# Altium footprint library SMD Active.PcbLib: 76 footprints (part 7 of 8)
Each footprint in its own frame and in the unit in brackets; x right, y up, seen from the top. Pads: shape width x height; smd on the part's side, far side on the other; paste and mask are expansions set on the pad; w line width, h text height; cw(c..) or ccw(c..) is an arc to the next point about the centre after c.
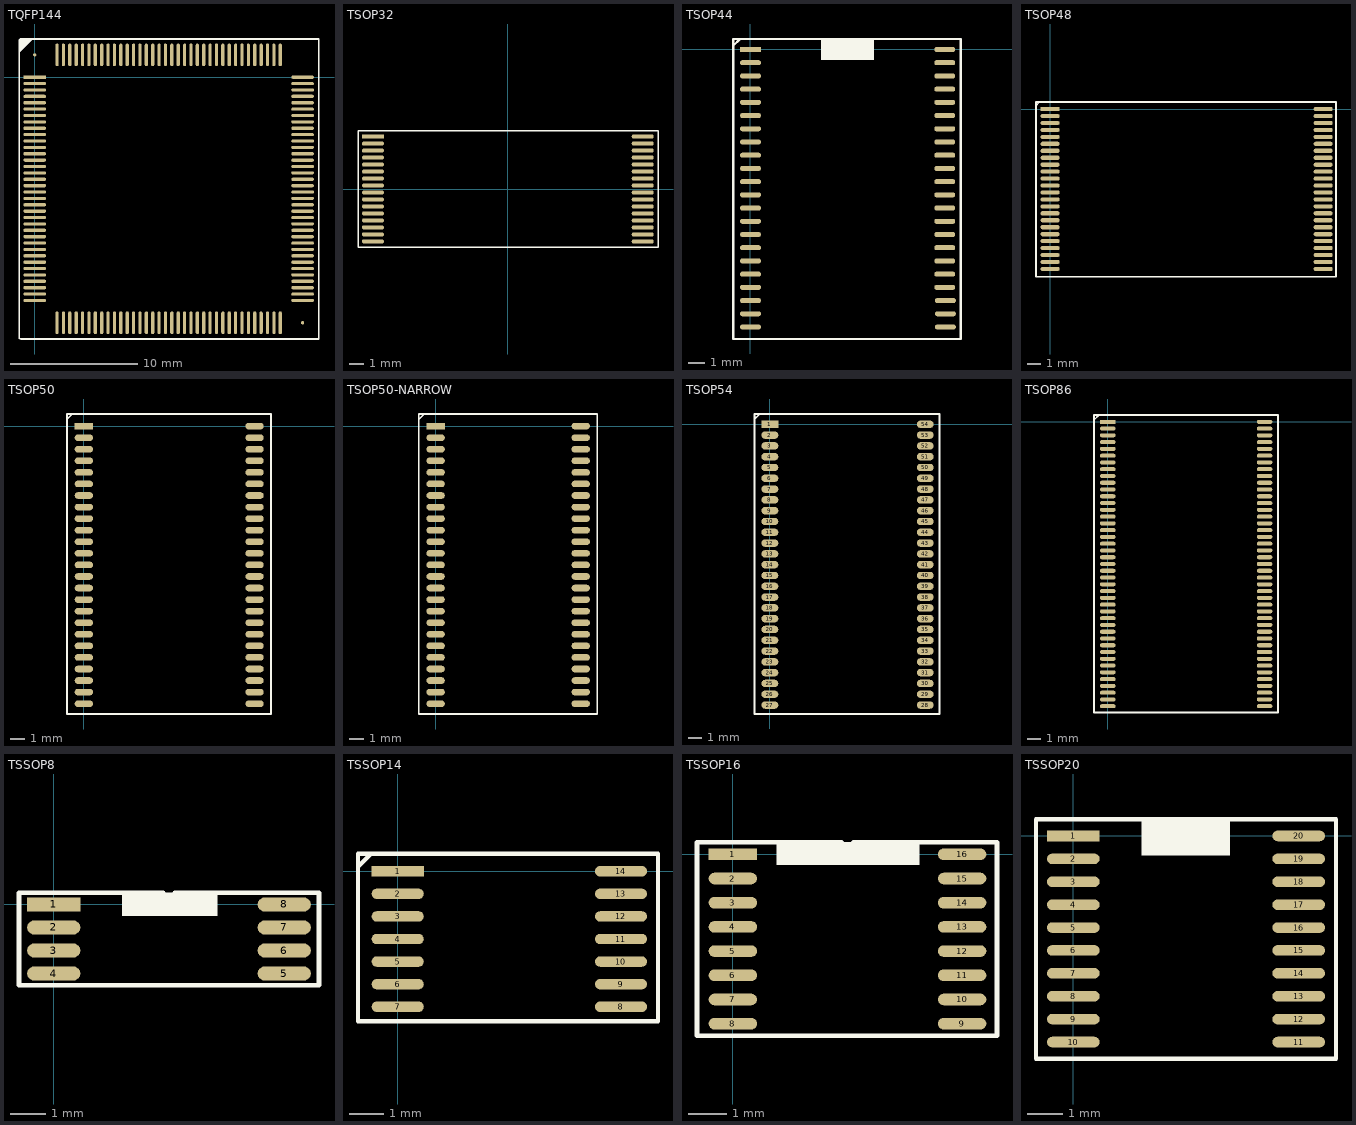
[diagram p6: the footprints below, top view; thin cyan lines are the x and y axes]

## TQFP144 [mil]
pads (146):
  rect 70x10 smd: 1(0,0)
  oval 70x10 smd: 2(0,-19.68) 3(0,-39.37) 4(0,-59.05) 5(0,-78.74) 6(0,-98.42) 7(0,-118.11) 8(0,-137.79) 9(0,-157.48) 10(0,-177.16) 11(0,-196.85) 12(0,-216.53) 13(0,-236.22) 14(0,-255.91) 15(0,-275.59) 16(0,-295.27) 17(0,-314.96) 18(0,-334.64) 19(0,-354.33) 20(0,-374.01) 21(0,-393.7) 22(0,-413.38) 23(0,-433.07) 24(0,-452.75) 25(0,-472.44) 26(0,-492.12) 27(0,-511.81) 28(0,-531.5) 29(0,-551.18) 30(0,-570.87) 31(0,-590.55) 32(0,-610.24) 33(0,-629.92) 34(0,-649.61) 35(0,-669.29) 36(0,-688.98) 73(826.77,-688.98) 74(826.77,-669.29) 75(826.77,-649.61) 76(826.77,-629.92) 77(826.77,-610.24) 78(826.77,-590.55) 79(826.77,-570.87) 80(826.77,-551.18) 81(826.77,-531.5) 82(826.77,-511.81) 83(826.77,-492.12) 84(826.77,-472.44) 85(826.77,-452.75) 86(826.77,-433.07) 87(826.77,-413.38) 88(826.77,-393.7) 89(826.77,-374.01) 90(826.77,-354.33) 91(826.77,-334.64) 92(826.77,-314.96) 93(826.77,-295.27) 94(826.77,-275.59) 95(826.77,-255.91) 96(826.77,-236.22) 97(826.77,-216.53) 98(826.77,-196.85) 99(826.77,-177.16) 100(826.77,-157.48) 101(826.77,-137.79) 102(826.77,-118.11) 103(826.77,-98.42) 104(826.77,-78.74) 105(826.77,-59.05) 106(826.77,-39.37) 107(826.77,-19.68) 108(826.77,0)
  oval 10x70 smd: 37(68.9,-757.87) 38(88.58,-757.87) 39(108.27,-757.87) 40(127.95,-757.87) 41(147.64,-757.87) 42(167.32,-757.87) 43(187.01,-757.87) 44(206.69,-757.87) 45(226.38,-757.87) 46(246.06,-757.87) 47(265.75,-757.87) 48(285.43,-757.87) 49(305.12,-757.87) 50(324.8,-757.87) 51(344.49,-757.87) 52(364.17,-757.87) 53(383.86,-757.87) 54(403.54,-757.87) 55(423.23,-757.87) 56(442.91,-757.87) 57(462.6,-757.87) 58(482.28,-757.87) 59(501.97,-757.87) 60(521.65,-757.87) 61(541.34,-757.87) 62(561.02,-757.87) 63(580.71,-757.87) 64(600.39,-757.87) 65(620.08,-757.87) 66(639.76,-757.87) 67(659.45,-757.87) 68(679.13,-757.87) 69(698.82,-757.87) 70(718.5,-757.87) 71(738.19,-757.87) 72(757.87,-757.87) 109(757.87,68.9) 110(738.19,68.9) 111(718.5,68.9) 112(698.82,68.9) 113(679.13,68.9) 114(659.45,68.9) 115(639.76,68.9) 116(620.08,68.9) 117(600.39,68.9) 118(580.71,68.9) 119(561.02,68.9) 120(541.34,68.9) 121(521.65,68.9) 122(501.97,68.9) 123(482.28,68.9) 124(462.6,68.9) 125(442.91,68.9) 126(423.23,68.9) 127(403.54,68.9) 128(383.86,68.9) 129(364.17,68.9) 130(344.49,68.9) 131(324.8,68.9) 132(305.12,68.9) 133(285.43,68.9) 134(265.75,68.9) 135(246.06,68.9) 136(226.38,68.9) 137(206.69,68.9) 138(187.01,68.9) 139(167.32,68.9) 140(147.64,68.9) 141(127.95,68.9) 142(108.27,68.9) 143(88.58,68.9) 144(68.9,68.9)
  round 10 smd: F1(0,68.9) F1(826.77,-757.87)
Top Overlay:
  lines w5: -20.12,114.88 -45.12,89.88 ; -13,118 -45,118 -48.12,114.88 ; -48.12,114.88 -35.12,114.88 ; -48.12,114.88 -42,118 877,118 877,-808 -43,-808 -48.12,-805.88 -48.12,114.88 ; -48.12,114.88 -48.12,107.88 -41.12,114.88 ; -45.12,89.88 -45.12,94.88 -25.12,114.88 ; -45.12,89.88 -45.12,110.88 ; -45.12,89.88 -45.12,110.88 ; -45.12,110.88 -41.12,114.88 ; -45.12,110.88 -41.12,114.88 ; -41.12,114.88 -25.12,114.88 ; -41.12,114.88 -16.24,114.88 -48.12,83 -48.12,77.88 -11.12,114.88 -25.12,114.88 ; -41.12,114.88 -35.12,114.88 ; -35.12,114.88 -45.12,104.88 -45.12,99.88 -30.12,114.88 -25.12,114.88
3D body: height 12, standoff 0, extent 752.24,53.9 764.24,75.9
3D body: height 25, standoff 12, extent 752.24,29.9 764.24,62.4
3D body: height 25, standoff 12, extent 732.56,29.9 744.56,62.4
3D body: height 12, standoff 0, extent 732.56,53.9 744.56,75.9
3D body: height 25, standoff 12, extent 712.87,29.9 724.87,62.4
3D body: height 12, standoff 0, extent 712.87,53.9 724.87,75.9
3D body: height 25, standoff 12, extent 693.19,29.9 705.19,62.4
3D body: height 12, standoff 0, extent 693.19,53.9 705.19,75.9
3D body: height 25, standoff 12, extent 673.5,29.9 685.5,62.4
3D body: height 12, standoff 0, extent 673.5,53.9 685.5,75.9
3D body: height 25, standoff 12, extent 653.82,29.9 665.82,62.4
3D body: height 12, standoff 0, extent 653.82,53.9 665.82,75.9
3D body: height 12, standoff 0, extent 535.71,53.9 547.71,75.9
3D body: height 25, standoff 12, extent 535.71,29.9 547.71,62.4
3D body: height 12, standoff 0, extent 555.39,53.9 567.39,75.9
3D body: height 25, standoff 12, extent 555.39,29.9 567.39,62.4
3D body: height 12, standoff 0, extent 575.08,53.9 587.08,75.9
3D body: height 25, standoff 12, extent 575.08,29.9 587.08,62.4
3D body: height 12, standoff 0, extent 594.76,53.9 606.76,75.9
3D body: height 25, standoff 12, extent 594.76,29.9 606.76,62.4
3D body: height 12, standoff 0, extent 614.45,53.9 626.45,75.9
3D body: height 25, standoff 12, extent 614.45,29.9 626.45,62.4
3D body: height 25, standoff 12, extent 634.13,29.9 646.13,62.4
3D body: height 12, standoff 0, extent 634.13,53.9 646.13,75.9
3D body: height 12, standoff 0, extent 417.6,53.9 429.6,75.9
3D body: height 25, standoff 12, extent 417.6,29.9 429.6,62.4
3D body: height 12, standoff 0, extent 437.28,53.9 449.28,75.9
3D body: height 25, standoff 12, extent 437.28,29.9 449.28,62.4
3D body: height 12, standoff 0, extent 456.97,53.9 468.97,75.9
3D body: height 25, standoff 12, extent 456.97,29.9 468.97,62.4
3D body: height 12, standoff 0, extent 476.65,53.9 488.65,75.9
3D body: height 25, standoff 12, extent 476.65,29.9 488.65,62.4
3D body: height 12, standoff 0, extent 496.34,53.9 508.34,75.9
3D body: height 25, standoff 12, extent 496.34,29.9 508.34,62.4
3D body: height 25, standoff 12, extent 516.02,29.9 528.02,62.4
3D body: height 12, standoff 0, extent 516.02,53.9 528.02,75.9
3D body: height 12, standoff 0, extent 299.49,53.9 311.49,75.9
3D body: height 25, standoff 12, extent 299.49,29.9 311.49,62.4
3D body: height 12, standoff 0, extent 319.17,53.9 331.17,75.9
3D body: height 25, standoff 12, extent 319.17,29.9 331.17,62.4
3D body: height 12, standoff 0, extent 338.86,53.9 350.86,75.9
3D body: height 25, standoff 12, extent 338.86,29.9 350.86,62.4
3D body: height 12, standoff 0, extent 358.54,53.9 370.54,75.9
3D body: height 25, standoff 12, extent 358.54,29.9 370.54,62.4
3D body: height 12, standoff 0, extent 378.23,53.9 390.23,75.9
3D body: height 25, standoff 12, extent 378.23,29.9 390.23,62.4
3D body: height 25, standoff 12, extent 397.91,29.9 409.91,62.4
3D body: height 12, standoff 0, extent 397.91,53.9 409.91,75.9
3D body: height 12, standoff 0, extent 181.38,53.9 193.38,75.9
3D body: height 25, standoff 12, extent 181.38,29.9 193.38,62.4
3D body: height 12, standoff 0, extent 201.06,53.9 213.06,75.9
3D body: height 25, standoff 12, extent 201.06,29.9 213.06,62.4
3D body: height 12, standoff 0, extent 220.75,53.9 232.75,75.9
3D body: height 25, standoff 12, extent 220.75,29.9 232.75,62.4
3D body: height 12, standoff 0, extent 240.43,53.9 252.43,75.9
3D body: height 25, standoff 12, extent 240.43,29.9 252.43,62.4
3D body: height 12, standoff 0, extent 260.12,53.9 272.12,75.9
3D body: height 25, standoff 12, extent 260.12,29.9 272.12,62.4
3D body: height 25, standoff 12, extent 279.8,29.9 291.8,62.4
3D body: height 12, standoff 0, extent 279.8,53.9 291.8,75.9
3D body: height 12, standoff 0, extent 63.27,53.9 75.27,75.9
3D body: height 25, standoff 12, extent 63.27,29.9 75.27,62.4
3D body: height 12, standoff 0, extent 82.95,53.9 94.95,75.9
3D body: height 25, standoff 12, extent 82.95,29.9 94.95,62.4
3D body: height 12, standoff 0, extent 102.64,53.9 114.64,75.9
3D body: height 25, standoff 12, extent 102.64,29.9 114.64,62.4
3D body: height 12, standoff 0, extent 122.32,53.9 134.32,75.9
3D body: height 25, standoff 12, extent 122.32,29.9 134.32,62.4
3D body: height 12, standoff 0, extent 142.01,53.9 154.01,75.9
3D body: height 25, standoff 12, extent 142.01,29.9 154.01,62.4
3D body: height 25, standoff 12, extent 161.69,29.9 173.69,62.4
3D body: height 12, standoff 0, extent 161.69,53.9 173.69,75.9
3D body: height 12, standoff 0, extent 811.77,-695.35 833.77,-683.35
3D body: height 25, standoff 12, extent 787.77,-695.35 820.27,-683.35
3D body: height 25, standoff 12, extent 787.77,-675.66 820.27,-663.66
3D body: height 12, standoff 0, extent 811.77,-675.66 833.77,-663.66
3D body: height 25, standoff 12, extent 787.77,-655.98 820.27,-643.98
3D body: height 12, standoff 0, extent 811.77,-655.98 833.77,-643.98
3D body: height 25, standoff 12, extent 787.77,-636.29 820.27,-624.29
3D body: height 12, standoff 0, extent 811.77,-636.29 833.77,-624.29
3D body: height 25, standoff 12, extent 787.77,-616.61 820.27,-604.61
3D body: height 12, standoff 0, extent 811.77,-616.61 833.77,-604.61
3D body: height 25, standoff 12, extent 787.77,-596.92 820.27,-584.92
3D body: height 12, standoff 0, extent 811.77,-596.92 833.77,-584.92
3D body: height 12, standoff 0, extent 811.77,-478.81 833.77,-466.81
3D body: height 25, standoff 12, extent 787.77,-478.81 820.27,-466.81
3D body: height 12, standoff 0, extent 811.77,-498.5 833.77,-486.5
3D body: height 25, standoff 12, extent 787.77,-498.5 820.27,-486.5
3D body: height 12, standoff 0, extent 811.77,-518.18 833.77,-506.18
3D body: height 25, standoff 12, extent 787.77,-518.18 820.27,-506.18
3D body: height 12, standoff 0, extent 811.77,-537.87 833.77,-525.87
3D body: height 25, standoff 12, extent 787.77,-537.87 820.27,-525.87
3D body: height 12, standoff 0, extent 811.77,-557.55 833.77,-545.55
3D body: height 25, standoff 12, extent 787.77,-557.55 820.27,-545.55
3D body: height 25, standoff 12, extent 787.77,-577.24 820.27,-565.24
3D body: height 12, standoff 0, extent 811.77,-577.24 833.77,-565.24
3D body: height 12, standoff 0, extent 811.77,-360.7 833.77,-348.7
3D body: height 25, standoff 12, extent 787.77,-360.7 820.27,-348.7
3D body: height 12, standoff 0, extent 811.77,-380.39 833.77,-368.39
3D body: height 25, standoff 12, extent 787.77,-380.39 820.27,-368.39
3D body: height 12, standoff 0, extent 811.77,-400.07 833.77,-388.07
3D body: height 25, standoff 12, extent 787.77,-400.07 820.27,-388.07
3D body: height 12, standoff 0, extent 811.77,-419.76 833.77,-407.76
3D body: height 25, standoff 12, extent 787.77,-419.76 820.27,-407.76
3D body: height 12, standoff 0, extent 811.77,-439.44 833.77,-427.44
3D body: height 25, standoff 12, extent 787.77,-439.44 820.27,-427.44
3D body: height 25, standoff 12, extent 787.77,-459.13 820.27,-447.13
3D body: height 12, standoff 0, extent 811.77,-459.13 833.77,-447.13
3D body: height 12, standoff 0, extent 811.77,-242.59 833.77,-230.59
3D body: height 25, standoff 12, extent 787.77,-242.59 820.27,-230.59
3D body: height 12, standoff 0, extent 811.77,-262.28 833.77,-250.28
3D body: height 25, standoff 12, extent 787.77,-262.28 820.27,-250.28
3D body: height 12, standoff 0, extent 811.77,-281.96 833.77,-269.96
3D body: height 25, standoff 12, extent 787.77,-281.96 820.27,-269.96
3D body: height 12, standoff 0, extent 811.77,-301.65 833.77,-289.65
3D body: height 25, standoff 12, extent 787.77,-301.65 820.27,-289.65
3D body: height 12, standoff 0, extent 811.77,-321.33 833.77,-309.33
3D body: height 25, standoff 12, extent 787.77,-321.33 820.27,-309.33
3D body: height 25, standoff 12, extent 787.77,-341.02 820.27,-329.02
3D body: height 12, standoff 0, extent 811.77,-341.02 833.77,-329.02
3D body: height 12, standoff 0, extent 811.77,-124.48 833.77,-112.48
3D body: height 25, standoff 12, extent 787.77,-124.48 820.27,-112.48
3D body: height 12, standoff 0, extent 811.77,-144.17 833.77,-132.17
3D body: height 25, standoff 12, extent 787.77,-144.17 820.27,-132.17
3D body: height 12, standoff 0, extent 811.77,-163.85 833.77,-151.85
3D body: height 25, standoff 12, extent 787.77,-163.85 820.27,-151.85
3D body: height 12, standoff 0, extent 811.77,-183.54 833.77,-171.54
3D body: height 25, standoff 12, extent 787.77,-183.54 820.27,-171.54
3D body: height 12, standoff 0, extent 811.77,-203.22 833.77,-191.22
3D body: height 25, standoff 12, extent 787.77,-203.22 820.27,-191.22
3D body: height 25, standoff 12, extent 787.77,-222.91 820.27,-210.91
3D body: height 12, standoff 0, extent 811.77,-222.91 833.77,-210.91
3D body: height 12, standoff 0, extent 811.77,-6.37 833.77,5.63
3D body: height 25, standoff 12, extent 787.77,-6.37 820.27,5.63
3D body: height 12, standoff 0, extent 811.77,-26.06 833.77,-14.06
3D body: height 25, standoff 12, extent 787.77,-26.06 820.27,-14.06
3D body: height 12, standoff 0, extent 811.77,-45.74 833.77,-33.74
3D body: height 25, standoff 12, extent 787.77,-45.74 820.27,-33.74
3D body: height 12, standoff 0, extent 811.77,-65.43 833.77,-53.43
3D body: height 25, standoff 12, extent 787.77,-65.43 820.27,-53.43
3D body: height 12, standoff 0, extent 811.77,-85.11 833.77,-73.11
3D body: height 25, standoff 12, extent 787.77,-85.11 820.27,-73.11
3D body: height 25, standoff 12, extent 787.77,-104.8 820.27,-92.8
3D body: height 12, standoff 0, extent 811.77,-104.8 833.77,-92.8
3D body: height 12, standoff 0, extent 62.53,-764.87 74.53,-742.87
3D body: height 25, standoff 12, extent 62.53,-751.37 74.53,-718.87
3D body: height 25, standoff 12, extent 82.21,-751.37 94.21,-718.87
3D body: height 12, standoff 0, extent 82.21,-764.87 94.21,-742.87
3D body: height 25, standoff 12, extent 101.9,-751.37 113.9,-718.87
3D body: height 12, standoff 0, extent 101.9,-764.87 113.9,-742.87
3D body: height 25, standoff 12, extent 121.58,-751.37 133.58,-718.87
3D body: height 12, standoff 0, extent 121.58,-764.87 133.58,-742.87
3D body: height 25, standoff 12, extent 141.27,-751.37 153.27,-718.87
3D body: height 12, standoff 0, extent 141.27,-764.87 153.27,-742.87
3D body: height 25, standoff 12, extent 160.95,-751.37 172.95,-718.87
3D body: height 12, standoff 0, extent 160.95,-764.87 172.95,-742.87
3D body: height 12, standoff 0, extent 279.06,-764.87 291.06,-742.87
3D body: height 25, standoff 12, extent 279.06,-751.37 291.06,-718.87
3D body: height 12, standoff 0, extent 259.38,-764.87 271.38,-742.87
3D body: height 25, standoff 12, extent 259.38,-751.37 271.38,-718.87
3D body: height 12, standoff 0, extent 239.69,-764.87 251.69,-742.87
3D body: height 25, standoff 12, extent 239.69,-751.37 251.69,-718.87
3D body: height 12, standoff 0, extent 220.01,-764.87 232.01,-742.87
3D body: height 25, standoff 12, extent 220.01,-751.37 232.01,-718.87
3D body: height 12, standoff 0, extent 200.32,-764.87 212.32,-742.87
3D body: height 25, standoff 12, extent 200.32,-751.37 212.32,-718.87
3D body: height 25, standoff 12, extent 180.64,-751.37 192.64,-718.87
3D body: height 12, standoff 0, extent 180.64,-764.87 192.64,-742.87
3D body: height 12, standoff 0, extent 397.17,-764.87 409.17,-742.87
3D body: height 25, standoff 12, extent 397.17,-751.37 409.17,-718.87
3D body: height 12, standoff 0, extent 377.49,-764.87 389.49,-742.87
3D body: height 25, standoff 12, extent 377.49,-751.37 389.49,-718.87
3D body: height 12, standoff 0, extent 357.8,-764.87 369.8,-742.87
3D body: height 25, standoff 12, extent 357.8,-751.37 369.8,-718.87
3D body: height 12, standoff 0, extent 338.12,-764.87 350.12,-742.87
3D body: height 25, standoff 12, extent 338.12,-751.37 350.12,-718.87
3D body: height 12, standoff 0, extent 318.43,-764.87 330.43,-742.87
3D body: height 25, standoff 12, extent 318.43,-751.37 330.43,-718.87
3D body: height 25, standoff 12, extent 298.75,-751.37 310.75,-718.87
3D body: height 12, standoff 0, extent 298.75,-764.87 310.75,-742.87
3D body: height 12, standoff 0, extent 515.28,-764.87 527.28,-742.87
3D body: height 25, standoff 12, extent 515.28,-751.37 527.28,-718.87
3D body: height 12, standoff 0, extent 495.6,-764.87 507.6,-742.87
3D body: height 25, standoff 12, extent 495.6,-751.37 507.6,-718.87
3D body: height 12, standoff 0, extent 475.91,-764.87 487.91,-742.87
3D body: height 25, standoff 12, extent 475.91,-751.37 487.91,-718.87
3D body: height 12, standoff 0, extent 456.23,-764.87 468.23,-742.87
3D body: height 25, standoff 12, extent 456.23,-751.37 468.23,-718.87
3D body: height 12, standoff 0, extent 436.54,-764.87 448.54,-742.87
3D body: height 25, standoff 12, extent 436.54,-751.37 448.54,-718.87
3D body: height 25, standoff 12, extent 416.86,-751.37 428.86,-718.87
3D body: height 12, standoff 0, extent 416.86,-764.87 428.86,-742.87
3D body: height 12, standoff 0, extent 633.39,-764.87 645.39,-742.87
3D body: height 25, standoff 12, extent 633.39,-751.37 645.39,-718.87
3D body: height 12, standoff 0, extent 613.71,-764.87 625.71,-742.87
3D body: height 25, standoff 12, extent 613.71,-751.37 625.71,-718.87
3D body: height 12, standoff 0, extent 594.02,-764.87 606.02,-742.87
3D body: height 25, standoff 12, extent 594.02,-751.37 606.02,-718.87
3D body: height 12, standoff 0, extent 574.34,-764.87 586.34,-742.87
3D body: height 25, standoff 12, extent 574.34,-751.37 586.34,-718.87
3D body: height 12, standoff 0, extent 554.65,-764.87 566.65,-742.87
3D body: height 25, standoff 12, extent 554.65,-751.37 566.65,-718.87
3D body: height 25, standoff 12, extent 534.97,-751.37 546.97,-718.87
3D body: height 12, standoff 0, extent 534.97,-764.87 546.97,-742.87
3D body: height 12, standoff 0, extent 751.5,-764.87 763.5,-742.87
3D body: height 25, standoff 12, extent 751.5,-751.37 763.5,-718.87
3D body: height 12, standoff 0, extent 731.82,-764.87 743.82,-742.87
3D body: height 25, standoff 12, extent 731.82,-751.37 743.82,-718.87
3D body: height 12, standoff 0, extent 712.13,-764.87 724.13,-742.87
3D body: height 25, standoff 12, extent 712.13,-751.37 724.13,-718.87
3D body: height 12, standoff 0, extent 692.45,-764.87 704.45,-742.87
3D body: height 25, standoff 12, extent 692.45,-751.37 704.45,-718.87
3D body: height 12, standoff 0, extent 672.76,-764.87 684.76,-742.87
3D body: height 25, standoff 12, extent 672.76,-751.37 684.76,-718.87
3D body: height 25, standoff 12, extent 653.08,-751.37 665.08,-718.87
3D body: height 12, standoff 0, extent 653.08,-764.87 665.08,-742.87
3D body: height 12, standoff 0, extent -7,-596.18 15,-584.18
3D body: height 25, standoff 12, extent 6.5,-596.18 39,-584.18
3D body: height 25, standoff 12, extent 6.5,-615.86 39,-603.86
3D body: height 12, standoff 0, extent -7,-615.86 15,-603.86
3D body: height 25, standoff 12, extent 6.5,-635.55 39,-623.55
3D body: height 12, standoff 0, extent -7,-635.55 15,-623.55
3D body: height 25, standoff 12, extent 6.5,-655.23 39,-643.23
3D body: height 12, standoff 0, extent -7,-655.23 15,-643.23
3D body: height 25, standoff 12, extent 6.5,-674.92 39,-662.92
3D body: height 12, standoff 0, extent -7,-674.92 15,-662.92
3D body: height 25, standoff 12, extent 6.5,-694.6 39,-682.6
3D body: height 12, standoff 0, extent -7,-694.6 15,-682.6
3D body: height 12, standoff 0, extent -7,-478.07 15,-466.07
3D body: height 25, standoff 12, extent 6.5,-478.07 39,-466.07
3D body: height 25, standoff 12, extent 6.5,-497.75 39,-485.75
3D body: height 12, standoff 0, extent -7,-497.75 15,-485.75
3D body: height 25, standoff 12, extent 6.5,-517.44 39,-505.44
3D body: height 12, standoff 0, extent -7,-517.44 15,-505.44
3D body: height 25, standoff 12, extent 6.5,-537.12 39,-525.12
3D body: height 12, standoff 0, extent -7,-537.12 15,-525.12
3D body: height 25, standoff 12, extent 6.5,-556.81 39,-544.81
3D body: height 12, standoff 0, extent -7,-556.81 15,-544.81
3D body: height 25, standoff 12, extent 6.5,-576.49 39,-564.49
3D body: height 12, standoff 0, extent -7,-576.49 15,-564.49
3D body: height 12, standoff 0, extent -7,-359.96 15,-347.96
3D body: height 25, standoff 12, extent 6.5,-359.96 39,-347.96
3D body: height 25, standoff 12, extent 6.5,-379.64 39,-367.64
3D body: height 12, standoff 0, extent -7,-379.64 15,-367.64
3D body: height 25, standoff 12, extent 6.5,-399.33 39,-387.33
3D body: height 12, standoff 0, extent -7,-399.33 15,-387.33
3D body: height 25, standoff 12, extent 6.5,-419.01 39,-407.01
3D body: height 12, standoff 0, extent -7,-419.01 15,-407.01
3D body: height 25, standoff 12, extent 6.5,-438.7 39,-426.7
3D body: height 12, standoff 0, extent -7,-438.7 15,-426.7
3D body: height 25, standoff 12, extent 6.5,-458.38 39,-446.38
3D body: height 12, standoff 0, extent -7,-458.38 15,-446.38
3D body: height 12, standoff 0, extent -7,-241.85 15,-229.85
3D body: height 25, standoff 12, extent 6.5,-241.85 39,-229.85
3D body: height 25, standoff 12, extent 6.5,-261.53 39,-249.53
3D body: height 12, standoff 0, extent -7,-261.53 15,-249.53
3D body: height 25, standoff 12, extent 6.5,-281.22 39,-269.22
3D body: height 12, standoff 0, extent -7,-281.22 15,-269.22
3D body: height 25, standoff 12, extent 6.5,-300.9 39,-288.9
3D body: height 12, standoff 0, extent -7,-300.9 15,-288.9
3D body: height 25, standoff 12, extent 6.5,-320.59 39,-308.59
3D body: height 12, standoff 0, extent -7,-320.59 15,-308.59
3D body: height 25, standoff 12, extent 6.5,-340.27 39,-328.27
3D body: height 12, standoff 0, extent -7,-340.27 15,-328.27
3D body: height 12, standoff 0, extent -7,-123.74 15,-111.74
3D body: height 25, standoff 12, extent 6.5,-123.74 39,-111.74
3D body: height 25, standoff 12, extent 6.5,-143.42 39,-131.42
3D body: height 12, standoff 0, extent -7,-143.42 15,-131.42
3D body: height 25, standoff 12, extent 6.5,-163.11 39,-151.11
3D body: height 12, standoff 0, extent -7,-163.11 15,-151.11
3D body: height 25, standoff 12, extent 6.5,-182.79 39,-170.79
3D body: height 12, standoff 0, extent -7,-182.79 15,-170.79
3D body: height 25, standoff 12, extent 6.5,-202.48 39,-190.48
3D body: height 12, standoff 0, extent -7,-202.48 15,-190.48
3D body: height 25, standoff 12, extent 6.5,-222.16 39,-210.16
3D body: height 12, standoff 0, extent -7,-222.16 15,-210.16
3D body: height 12, standoff 0, extent -7,-104.05 15,-92.05
3D body: height 25, standoff 12, extent 6.5,-104.05 39,-92.05
3D body: height 12, standoff 0, extent -7,-84.37 15,-72.37
3D body: height 25, standoff 12, extent 6.5,-84.37 39,-72.37
3D body: height 12, standoff 0, extent -7,-64.68 15,-52.68
3D body: height 25, standoff 12, extent 6.5,-64.68 39,-52.68
3D body: height 12, standoff 0, extent -7,-45 15,-33
3D body: height 25, standoff 12, extent 6.5,-45 39,-33
3D body: height 12, standoff 0, extent -7,-25.31 15,-13.31
3D body: height 25, standoff 12, extent 6.5,-25.31 39,-13.31
3D body: height 25, standoff 12, extent 6.5,-5.63 39,6.37
3D body: height 12, standoff 0, extent -7,-5.63 15,6.37
3D body: height 40, standoff 0, extent 32.4,-722 789,32

## TSOP32 [mm] "TSSOP, 32-Leads, Body 8.1x18.5mm (max), Pitch 0.50mm, IPC Medium Density"
height 1.2
pads (32):
  rect 1.575x0.305 smd: 1(-9.65,3.75)
  oval 1.575x0.305 smd: 2(-9.65,3.25) 3(-9.65,2.75) 4(-9.65,2.25) 5(-9.65,1.75) 6(-9.65,1.25) 7(-9.65,0.75) 8(-9.65,0.25) 9(-9.65,-0.25) 10(-9.65,-0.75) 11(-9.65,-1.25) 12(-9.65,-1.75) 13(-9.65,-2.25) 14(-9.65,-2.75) 15(-9.65,-3.25) 16(-9.65,-3.75) 17(9.65,-3.75) 18(9.65,-3.25) 19(9.65,-2.75) 20(9.65,-2.25) 21(9.65,-1.75) 22(9.65,-1.25) 23(9.65,-0.75) 24(9.65,-0.25) 25(9.65,0.25) 26(9.65,0.75) 27(9.65,1.25) 28(9.65,1.75) 29(9.65,2.25) 30(9.65,2.75) 31(9.65,3.25) 32(9.65,3.75)
Top Overlay:
  lines w0.102: -10.719,-4.166 10.744,-4.166 10.744,4.166 -10.719,4.166 -10.719,-4.166
3D body: height 1.17, standoff 1.14, extent -8.43,3.311 -7.912,3.829
3D body: height 0.3, standoff 0, extent 9.269,-3.912 9.828,-3.607
3D body: height 0.64, standoff 0.3, extent 8.659,-3.912 9.485,-3.607
3D body: height 0.3, standoff 0, extent 9.269,-3.412 9.828,-3.107
3D body: height 0.64, standoff 0.3, extent 8.659,-3.412 9.485,-3.107
3D body: height 0.3, standoff 0, extent 9.269,-2.912 9.828,-2.607
3D body: height 0.64, standoff 0.3, extent 8.659,-2.912 9.485,-2.607
3D body: height 0.3, standoff 0, extent 9.269,-2.412 9.828,-2.107
3D body: height 0.64, standoff 0.3, extent 8.659,-2.412 9.485,-2.107
3D body: height 0.3, standoff 0, extent 9.269,-1.912 9.828,-1.607
3D body: height 0.64, standoff 0.3, extent 8.659,-1.912 9.485,-1.607
3D body: height 0.3, standoff 0, extent 9.269,-1.412 9.828,-1.107
3D body: height 0.64, standoff 0.3, extent 8.659,-1.412 9.485,-1.107
3D body: height 0.3, standoff 0, extent 9.269,-0.912 9.828,-0.607
3D body: height 0.64, standoff 0.3, extent 8.659,-0.912 9.485,-0.607
3D body: height 0.3, standoff 0, extent 9.269,-0.412 9.828,-0.107
3D body: height 0.64, standoff 0.3, extent 8.659,-0.412 9.485,-0.107
3D body: height 0.3, standoff 0, extent 9.269,0.088 9.828,0.393
3D body: height 0.64, standoff 0.3, extent 8.659,0.088 9.485,0.393
3D body: height 0.3, standoff 0, extent 9.269,0.588 9.828,0.893
3D body: height 0.64, standoff 0.3, extent 8.659,0.588 9.485,0.893
3D body: height 0.3, standoff 0, extent 9.269,1.088 9.828,1.393
3D body: height 0.64, standoff 0.3, extent 8.659,1.088 9.485,1.393
3D body: height 0.3, standoff 0, extent 9.269,1.588 9.828,1.893
3D body: height 0.64, standoff 0.3, extent 8.659,1.588 9.485,1.893
3D body: height 0.3, standoff 0, extent 9.269,2.088 9.828,2.393
3D body: height 0.64, standoff 0.3, extent 8.659,2.088 9.485,2.393
3D body: height 0.3, standoff 0, extent 9.269,2.588 9.828,2.893
3D body: height 0.64, standoff 0.3, extent 8.659,2.588 9.485,2.893
3D body: height 0.3, standoff 0, extent 9.269,3.088 9.828,3.393
3D body: height 0.64, standoff 0.3, extent 8.659,3.088 9.485,3.393
3D body: height 0.3, standoff 0, extent 9.269,3.588 9.828,3.893
3D body: height 0.64, standoff 0.3, extent 8.659,3.588 9.485,3.893
3D body: height 1.14, standoff 0.2, extent -8.763,-4.05 8.712,4.05
3D body: height 0.64, standoff 0.3, extent -9.485,-3.893 -8.659,-3.588
3D body: height 0.3, standoff 0, extent -9.828,-3.893 -9.269,-3.588
3D body: height 0.64, standoff 0.3, extent -9.485,-3.393 -8.659,-3.088
3D body: height 0.3, standoff 0, extent -9.828,-3.393 -9.269,-3.088
3D body: height 0.64, standoff 0.3, extent -9.485,-2.893 -8.659,-2.588
3D body: height 0.3, standoff 0, extent -9.828,-2.893 -9.269,-2.588
3D body: height 0.64, standoff 0.3, extent -9.485,-2.393 -8.659,-2.088
3D body: height 0.3, standoff 0, extent -9.828,-2.393 -9.269,-2.088
3D body: height 0.64, standoff 0.3, extent -9.485,-1.893 -8.659,-1.588
3D body: height 0.3, standoff 0, extent -9.828,-1.893 -9.269,-1.588
3D body: height 0.64, standoff 0.3, extent -9.485,-1.393 -8.659,-1.088
3D body: height 0.3, standoff 0, extent -9.828,-1.393 -9.269,-1.088
3D body: height 0.64, standoff 0.3, extent -9.485,-0.893 -8.659,-0.588
3D body: height 0.3, standoff 0, extent -9.828,-0.893 -9.269,-0.588
3D body: height 0.64, standoff 0.3, extent -9.485,-0.393 -8.659,-0.088
3D body: height 0.3, standoff 0, extent -9.828,-0.393 -9.269,-0.088
3D body: height 0.64, standoff 0.3, extent -9.485,0.107 -8.659,0.412
3D body: height 0.3, standoff 0, extent -9.828,0.107 -9.269,0.412
3D body: height 0.64, standoff 0.3, extent -9.485,0.607 -8.659,0.912
3D body: height 0.3, standoff 0, extent -9.828,0.607 -9.269,0.912
3D body: height 0.64, standoff 0.3, extent -9.485,1.107 -8.659,1.412
3D body: height 0.3, standoff 0, extent -9.828,1.107 -9.269,1.412
3D body: height 0.64, standoff 0.3, extent -9.485,1.607 -8.659,1.912
3D body: height 0.3, standoff 0, extent -9.828,1.607 -9.269,1.912
3D body: height 0.64, standoff 0.3, extent -9.485,2.107 -8.659,2.412
3D body: height 0.3, standoff 0, extent -9.828,2.107 -9.269,2.412
3D body: height 0.64, standoff 0.3, extent -9.485,2.607 -8.659,2.912
3D body: height 0.3, standoff 0, extent -9.828,2.607 -9.269,2.912
3D body: height 0.64, standoff 0.3, extent -9.485,3.107 -8.659,3.412
3D body: height 0.3, standoff 0, extent -9.828,3.107 -9.269,3.412
3D body: height 0.64, standoff 0.3, extent -9.485,3.607 -8.659,3.912
3D body: height 0.3, standoff 0, extent -9.828,3.607 -9.269,3.912

## TSOP44 [mil]
pads (44):
  rect 50x12 smd: 1(0,0)
  oval 50x12 smd: 2(0,-31.5) 3(0,-62.99) 4(0,-94.49) 5(0,-125.98) 6(0,-157.48) 7(0,-188.98) 8(0,-220.47) 9(0,-251.97) 10(0,-283.46) 11(0,-314.96) 12(0,-346.46) 13(0,-377.95) 14(0,-409.45) 15(0,-440.94) 16(0,-472.44) 17(0,-503.94) 18(0,-535.43) 19(0,-566.93) 20(0,-598.43) 21(0,-629.92) 22(0,-661.42) 23(464.57,-661.42) 24(464.57,-629.92) 25(464.57,-598.43) 26(462.99,-566.93) 27(462.99,-535.43) 28(462.99,-503.94) 29(462.99,-472.44) 30(462.99,-440.95) 31(462.99,-409.45) 32(462.99,-377.95) 33(462.99,-346.46) 34(462.99,-314.96) 35(462.99,-283.47) 36(462.99,-251.97) 37(462.99,-220.47) 38(462.99,-188.98) 39(462.99,-157.48) 40(462.99,-125.99) 41(462.99,-94.49) 42(462.99,-62.99) 43(462.99,-31.5) 44(462.99,0)
Top Overlay:
  rectangle: 168.31,-24.61 294.29,25
  lines w5: -41,7 -41,9 -25,25 ; -41,-690 -41,25 501,25 501,-690 -41,-690
3D body: height 12, standoff 0, extent -4,-5.68 18,6.32
3D body: height 25, standoff 12, extent 9.5,-5.68 42,6.32
3D body: height 12, standoff 0, extent -4,-37.18 18,-25.18
3D body: height 25, standoff 12, extent 9.5,-37.18 42,-25.18
3D body: height 12, standoff 0, extent -4,-68.68 18,-56.68
3D body: height 25, standoff 12, extent 9.5,-68.68 42,-56.68
3D body: height 12, standoff 0, extent -4,-100.17 18,-88.17
3D body: height 25, standoff 12, extent 9.5,-100.17 42,-88.17
3D body: height 25, standoff 12, extent 9.5,-226.16 42,-214.16
3D body: height 12, standoff 0, extent -4,-226.16 18,-214.16
3D body: height 25, standoff 12, extent 9.5,-194.66 42,-182.66
3D body: height 12, standoff 0, extent -4,-194.66 18,-182.66
3D body: height 25, standoff 12, extent 9.5,-163.16 42,-151.16
3D body: height 12, standoff 0, extent -4,-163.16 18,-151.16
3D body: height 25, standoff 12, extent 9.5,-131.67 42,-119.67
3D body: height 12, standoff 0, extent -4,-131.67 18,-119.67
3D body: height 25, standoff 12, extent 9.5,-352.14 42,-340.14
3D body: height 12, standoff 0, extent -4,-352.14 18,-340.14
3D body: height 25, standoff 12, extent 9.5,-320.65 42,-308.65
3D body: height 12, standoff 0, extent -4,-320.65 18,-308.65
3D body: height 25, standoff 12, extent 9.5,-289.15 42,-277.15
3D body: height 12, standoff 0, extent -4,-289.15 18,-277.15
3D body: height 25, standoff 12, extent 9.5,-257.65 42,-245.65
3D body: height 12, standoff 0, extent -4,-257.65 18,-245.65
3D body: height 25, standoff 12, extent 9.5,-478.13 42,-466.13
3D body: height 12, standoff 0, extent -4,-478.13 18,-466.13
3D body: height 25, standoff 12, extent 9.5,-446.63 42,-434.63
3D body: height 12, standoff 0, extent -4,-446.63 18,-434.63
3D body: height 25, standoff 12, extent 9.5,-415.13 42,-403.13
3D body: height 12, standoff 0, extent -4,-415.13 18,-403.13
3D body: height 25, standoff 12, extent 9.5,-383.64 42,-371.64
3D body: height 12, standoff 0, extent -4,-383.64 18,-371.64
3D body: height 25, standoff 12, extent 9.5,-604.11 42,-592.11
3D body: height 12, standoff 0, extent -4,-604.11 18,-592.11
3D body: height 25, standoff 12, extent 9.5,-572.61 42,-560.61
3D body: height 12, standoff 0, extent -4,-572.61 18,-560.61
3D body: height 25, standoff 12, extent 9.5,-541.12 42,-529.12
3D body: height 12, standoff 0, extent -4,-541.12 18,-529.12
3D body: height 25, standoff 12, extent 9.5,-509.62 42,-497.62
3D body: height 12, standoff 0, extent -4,-509.62 18,-497.62
3D body: height 25, standoff 12, extent 9.5,-667.1 42,-655.1
3D body: height 12, standoff 0, extent -4,-667.1 18,-655.1
3D body: height 25, standoff 12, extent 9.5,-635.61 42,-623.61
3D body: height 12, standoff 0, extent -4,-635.61 18,-623.61
3D body: height 12, standoff 0, extent 444.99,-37.81 466.99,-25.81
3D body: height 25, standoff 12, extent 420.99,-37.81 453.49,-25.81
3D body: height 12, standoff 0, extent 444.99,-6.32 466.99,5.68
3D body: height 25, standoff 12, extent 420.99,-6.32 453.49,5.68
3D body: height 12, standoff 0, extent 444.99,-163.8 466.99,-151.8
3D body: height 25, standoff 12, extent 420.99,-163.8 453.49,-151.8
3D body: height 12, standoff 0, extent 444.99,-132.3 466.99,-120.3
3D body: height 25, standoff 12, extent 420.99,-132.3 453.49,-120.3
3D body: height 12, standoff 0, extent 444.99,-100.8 466.99,-88.8
3D body: height 25, standoff 12, extent 420.99,-100.8 453.49,-88.8
3D body: height 12, standoff 0, extent 444.99,-69.31 466.99,-57.31
3D body: height 25, standoff 12, extent 420.99,-69.31 453.49,-57.31
3D body: height 12, standoff 0, extent 444.99,-289.78 466.99,-277.78
3D body: height 25, standoff 12, extent 420.99,-289.78 453.49,-277.78
3D body: height 12, standoff 0, extent 444.99,-258.29 466.99,-246.29
3D body: height 25, standoff 12, extent 420.99,-258.29 453.49,-246.29
3D body: height 12, standoff 0, extent 444.99,-226.79 466.99,-214.79
3D body: height 25, standoff 12, extent 420.99,-226.79 453.49,-214.79
3D body: height 12, standoff 0, extent 444.99,-195.29 466.99,-183.29
3D body: height 25, standoff 12, extent 420.99,-195.29 453.49,-183.29
3D body: height 12, standoff 0, extent 444.99,-415.77 466.99,-403.77
3D body: height 25, standoff 12, extent 420.99,-415.77 453.49,-403.77
3D body: height 12, standoff 0, extent 444.99,-384.27 466.99,-372.27
3D body: height 25, standoff 12, extent 420.99,-384.27 453.49,-372.27
3D body: height 12, standoff 0, extent 444.99,-352.77 466.99,-340.77
3D body: height 25, standoff 12, extent 420.99,-352.77 453.49,-340.77
3D body: height 12, standoff 0, extent 444.99,-321.28 466.99,-309.28
3D body: height 25, standoff 12, extent 420.99,-321.28 453.49,-309.28
3D body: height 12, standoff 0, extent 444.99,-541.75 466.99,-529.75
3D body: height 25, standoff 12, extent 420.99,-541.75 453.49,-529.75
3D body: height 12, standoff 0, extent 444.99,-510.25 466.99,-498.25
3D body: height 25, standoff 12, extent 420.99,-510.25 453.49,-498.25
3D body: height 12, standoff 0, extent 444.99,-478.76 466.99,-466.76
3D body: height 25, standoff 12, extent 420.99,-478.76 453.49,-466.76
3D body: height 12, standoff 0, extent 444.99,-447.26 466.99,-435.26
3D body: height 25, standoff 12, extent 420.99,-447.26 453.49,-435.26
3D body: height 25, standoff 12, extent 420.99,-573.25 453.49,-561.25
3D body: height 12, standoff 0, extent 444.99,-573.25 466.99,-561.25
3D body: height 25, standoff 12, extent 420.99,-604.74 453.49,-592.74
3D body: height 12, standoff 0, extent 444.99,-604.74 466.99,-592.74
3D body: height 25, standoff 12, extent 420.99,-636.24 453.49,-624.24
3D body: height 12, standoff 0, extent 444.99,-636.24 466.99,-624.24
3D body: height 25, standoff 12, extent 420.99,-667.73 453.49,-655.73
3D body: height 12, standoff 0, extent 444.99,-667.73 466.99,-655.73
3D body: height 40, standoff 0, extent 39.04,-685 423,24
3D body: height 41, standoff 40, extent 195.5,-9 273.5,16

## TSOP48 [mil]
pads (48):
  rect 54x12 smd: 1(0,0)
  oval 54x12 smd: 2(0,-19.68) 3(0,-39.37) 4(0,-59.05) 5(0,-78.74) 6(0,-98.42) 7(0,-118.11) 8(0,-137.79) 9(0,-157.48) 10(0,-177.16) 11(0,-196.85) 12(0,-216.53) 13(0,-236.22) 14(0,-255.91) 15(0,-275.59) 16(0,-295.27) 17(0,-314.96) 18(0,-334.64) 19(0,-354.33) 20(0,-374.01) 21(0,-393.7) 22(0,-413.38) 23(0,-433.07) 24(0,-452.75) 25(773.62,-452.75) 26(773.62,-433.07) 27(773.62,-413.38) 28(773.62,-393.7) 29(773.62,-374.01) 30(773.62,-354.33) 31(773.62,-334.64) 32(773.62,-314.96) 33(773.62,-295.27) 34(773.62,-275.59) 35(773.62,-255.91) 36(773.62,-236.22) 37(773.62,-216.53) 38(773.62,-196.85) 39(773.62,-177.16) 40(773.62,-157.48) 41(773.62,-137.79) 42(773.62,-118.11) 43(773.62,-98.42) 44(773.62,-78.74) 45(773.62,-59.05) 46(773.62,-39.37) 47(773.62,-19.68) 48(773.62,0)
Top Overlay:
  lines w5: -40,10 -30,20 -40,20 ; -40,20 -40,-475 810,-475 810,20 -40,20

## TSOP50 [mm]
pads (50):
  rect 1.27x0.457 smd: 1(0,0)
  oval 1.27x0.457 smd: 2(0,-0.8) 3(0,-1.6) 4(0,-2.4) 5(0,-3.2) 6(0,-4) 7(0,-4.8) 8(0,-5.6) 9(0,-6.4) 10(0,-7.2) 11(0,-8) 12(0,-8.8) 13(0,-9.6) 14(0,-10.4) 15(0,-11.2) 16(0,-12) 17(0,-12.8) 18(0,-13.6) 19(0,-14.4) 20(0,-15.2) 21(0,-16) 22(0,-16.8) 23(0,-17.6) 24(0,-18.4) 25(0,-19.2) 26(11.81,-19.2) 27(11.81,-18.4) 28(11.81,-17.6) 29(11.81,-16.8) 30(11.81,-16) 31(11.81,-15.2) 32(11.81,-14.4) 33(11.81,-13.6) 34(11.81,-12.8) 35(11.81,-12) 36(11.81,-11.2) 37(11.81,-10.4) 38(11.81,-9.6) 39(11.81,-8.8) 40(11.81,-8) 41(11.81,-7.2) 42(11.81,-6.4) 43(11.81,-5.6) 44(11.81,-4.8) 45(11.81,-4) 46(11.81,-3.2) 47(11.81,-2.4) 48(11.81,-1.6) 49(11.81,-0.8) 50(11.81,0)
Top Overlay:
  lines w0.127: -1.168,0.457 -0.787,0.838 -1.168,0.838 ; -1.168,0.838 12.951,0.838 12.951,-19.914 -1.168,-19.914 -1.168,0.838

## TSOP50-NARROW [mm]
pads (50):
  rect 1.27x0.457 smd: 1(0,0)
  oval 1.27x0.457 smd: 2(0,-0.8) 3(0,-1.6) 4(0,-2.4) 5(0,-3.2) 6(0,-4) 7(0,-4.8) 8(0,-5.6) 9(0,-6.4) 10(0,-7.2) 11(0,-8) 12(0,-8.8) 13(0,-9.6) 14(0,-10.4) 15(0,-11.2) 16(0,-12) 17(0,-12.8) 18(0,-13.6) 19(0,-14.4) 20(0,-15.2) 21(0,-16) 22(0,-16.8) 23(0,-17.6) 24(0,-18.4) 25(0,-19.2) 26(10.035,-19.2) 27(10.035,-18.4) 28(10.035,-17.6) 29(10.035,-16.8) 30(10.035,-16) 31(10.035,-15.2) 32(10.035,-14.4) 33(10.035,-13.6) 34(10.035,-12.8) 35(10.035,-12) 36(10.035,-11.2) 37(10.035,-10.4) 38(10.035,-9.6) 39(10.035,-8.8) 40(10.035,-8) 41(10.035,-7.2) 42(10.035,-6.4) 43(10.035,-5.6) 44(10.035,-4.8) 45(10.035,-4) 46(10.035,-3.2) 47(10.035,-2.4) 48(10.035,-1.6) 49(10.035,-0.8) 50(10.035,0)
Top Overlay:
  lines w0.127: -1.168,0.457 -0.787,0.838 -1.168,0.838 ; -1.168,0.838 -1.168,-19.914 11.176,-19.914 11.176,0.838 -1.168,0.838

## TSOP54 [mm]
pads (54):
  rect 1.25x0.55 smd: 1(0,0)
  oval 1.25x0.55 smd: 2(0,-0.8) 3(0,-1.6) 4(0,-2.4) 5(0,-3.2) 6(0,-4) 7(0,-4.8) 8(0,-5.6) 9(0,-6.4) 10(0,-7.2) 11(0,-8) 12(0,-8.8) 13(0,-9.6) 14(0,-10.4) 15(0,-11.2) 16(0,-12) 17(0,-12.8) 18(0,-13.6) 19(0,-14.4) 20(0,-15.2) 21(0,-16) 22(0,-16.8) 23(0,-17.6) 24(0,-18.4) 25(0,-19.2) 26(0,-20) 27(0,-20.8) 28(11.51,-20.8) 29(11.51,-20) 30(11.51,-19.2) 31(11.51,-18.4) 32(11.51,-17.6) 33(11.51,-16.8) 34(11.51,-16) 35(11.51,-15.2) 36(11.51,-14.4) 37(11.51,-13.6) 38(11.51,-12.8) 39(11.51,-12) 40(11.51,-11.2) 41(11.51,-10.4) 42(11.51,-9.6) 43(11.51,-8.8) 44(11.51,-8) 45(11.51,-7.2) 46(11.51,-6.4) 47(11.51,-5.6) 48(11.51,-4.8) 49(11.51,-4) 50(11.51,-3.2) 51(11.51,-2.4) 52(11.51,-1.6) 53(11.51,-0.8) 54(11.51,0)
Top Overlay:
  lines w0.127: -1.143,0.381 -0.762,0.762 -1.143,0.762 ; -1.143,0.762 -1.143,-21.463 12.573,-21.463 12.573,0.762 -1.143,0.762

## TSOP86 [mm]
pads (86):
  rect 1.15x0.3 smd: 1(0,0)
  oval 1.15x0.3 smd: 2(0,-0.5) 3(0,-1) 4(0,-1.5) 5(0,-2) 6(0,-2.5) 7(0,-3) 8(0,-3.5) 9(0,-4) 10(0,-4.5) 11(0,-5) 12(0,-5.5) 13(0,-6) 14(0,-6.5) 15(0,-7) 16(0,-7.5) 17(0,-8) 18(0,-8.5) 19(0,-9) 20(0,-9.5) 21(0,-10) 22(0,-10.5) 23(0,-11) 24(0,-11.5) 25(0,-12) 26(0,-12.5) 27(0,-13) 28(0,-13.5) 29(0,-14) 30(0,-14.5) 31(0,-15) 32(0,-15.5) 33(0,-16) 34(0,-16.5) 35(0,-17) 36(0,-17.5) 37(0,-18) 38(0,-18.5) 39(0,-19) 40(0,-19.5) 41(0,-20) 42(0,-20.5) 43(0,-21) 44(11.579,-21) 45(11.579,-20.5) 46(11.579,-20) 47(11.579,-19.5) 48(11.579,-19) 49(11.579,-18.5) 50(11.579,-18) 51(11.579,-17.5) 52(11.579,-17) 53(11.579,-16.5) 54(11.579,-16) 55(11.579,-15.5) 56(11.579,-15) 57(11.579,-14.5) 58(11.579,-14) 59(11.579,-13.5) 60(11.579,-13) 61(11.579,-12.5) 62(11.579,-12) 63(11.579,-11.5) 64(11.579,-11) 65(11.579,-10.5) 66(11.579,-10) 67(11.579,-9.5) 68(11.579,-9) 69(11.579,-8.5) 70(11.579,-8) 71(11.579,-7.5) 72(11.579,-7) 73(11.579,-6.5) 74(11.579,-6) 75(11.579,-5.5) 76(11.579,-5) 77(11.579,-4.5) 78(11.579,-4) 79(11.579,-3.5) 80(11.579,-3) 81(11.579,-2.5) 82(11.579,-2) 83(11.579,-1.5) 84(11.579,-1) 85(11.579,-0.5) 86(11.579,0)
Top Overlay:
  lines w0.127: -1.016,0.127 -0.635,0.508 -1.016,0.508 ; -1.016,0.508 -1.016,-21.463 12.573,-21.463 12.573,0.508 -1.016,0.508

## TSSOP8 [mm]
pads (8):
  rect 1.5x0.4 smd: 1(0,0)
  oval 1.5x0.4 smd: 2(0,-0.65) 3(0,-1.3) 4(0,-1.95) 5(6.5,-1.95) 6(6.5,-1.3) 7(6.5,-0.65) 8(6.5,0)
Top Overlay:
  rectangle: 1.93,-0.33 4.623,0.33
  lines w0.127: 3.087,0.325 -0.98,0.325 -0.98,-2.275 7.48,-2.275 7.48,0.325 3.412,0.325
3D body: height 0.3, standoff 0, extent 5.956,-0.178 6.515,0.127
3D body: height 0.64, standoff 0.3, extent 5.347,-0.178 6.172,0.127
3D body: height 0.3, standoff 0, extent 5.956,-0.813 6.515,-0.508
3D body: height 0.64, standoff 0.3, extent 5.347,-0.813 6.172,-0.508
3D body: height 0.3, standoff 0, extent 5.956,-1.448 6.515,-1.143
3D body: height 0.64, standoff 0.3, extent 5.347,-1.448 6.172,-1.143
3D body: height 0.3, standoff 0, extent 5.956,-2.083 6.515,-1.778
3D body: height 0.64, standoff 0.3, extent 5.347,-2.083 6.172,-1.778
3D body: height 0.3, standoff 0, extent -0.064,-2.083 0.495,-1.778
3D body: height 0.64, standoff 0.3, extent 0.279,-2.083 1.105,-1.778
3D body: height 0.3, standoff 0, extent -0.064,-1.448 0.495,-1.143
3D body: height 0.64, standoff 0.3, extent 0.279,-1.448 1.105,-1.143
3D body: height 0.3, standoff 0, extent -0.064,-0.813 0.495,-0.508
3D body: height 0.64, standoff 0.3, extent 0.279,-0.813 1.105,-0.508
3D body: height 1.04, standoff 1.02, extent 2.222,-0.381 4.204,0.254
3D body: height 0.64, standoff 0.3, extent 0.279,-0.178 1.105,0.127
3D body: height 0.3, standoff 0, extent -0.064,-0.178 0.495,0.127
3D body: height 1.02, standoff 0, extent 0.826,-2.261 5.601,0.305

## TSSOP14 [mm]
pads (14):
  rect 1.5x0.3 smd: 1(0,0)
  oval 1.5x0.3 smd: 2(0,-0.65) 3(0,-1.3) 4(0,-1.95) 5(0,-2.6) 6(0,-3.25) 7(0,-3.9) 8(6.426,-3.9) 9(6.426,-3.25) 10(6.426,-2.6) 11(6.426,-1.95) 12(6.426,-1.3) 13(6.426,-0.65) 14(6.426,0)
Top Overlay:
  lines w0.127: -1.143,0.127 -0.762,0.508 -1.143,0.508 ; -1.143,0.508 7.493,0.508 7.493,-4.318 -1.143,-4.318 -1.143,0.508
3D body: height 1.02, standoff 0, extent 0.774,-4.318 5.55,0.508
3D body: height 0.3, standoff 0, extent -0.114,-0.178 0.445,0.127
3D body: height 0.64, standoff 0.3, extent 0.229,-0.178 1.054,0.127
3D body: height 1.04, standoff 1.02, extent 2.172,-0.381 4.153,0.254
3D body: height 0.64, standoff 0.3, extent 0.229,-0.813 1.054,-0.508
3D body: height 0.3, standoff 0, extent -0.114,-0.813 0.445,-0.508
3D body: height 0.64, standoff 0.3, extent 0.229,-1.448 1.054,-1.143
3D body: height 0.3, standoff 0, extent -0.114,-1.448 0.445,-1.143
3D body: height 0.64, standoff 0.3, extent 0.229,-2.083 1.054,-1.778
3D body: height 0.3, standoff 0, extent -0.114,-2.083 0.445,-1.778
3D body: height 0.64, standoff 0.3, extent 0.229,-2.718 1.054,-2.413
3D body: height 0.3, standoff 0, extent -0.114,-2.718 0.445,-2.413
3D body: height 0.64, standoff 0.3, extent 0.229,-3.353 1.054,-3.048
3D body: height 0.3, standoff 0, extent -0.114,-3.353 0.445,-3.048
3D body: height 0.64, standoff 0.3, extent 0.229,-3.988 1.054,-3.683
3D body: height 0.3, standoff 0, extent -0.114,-3.988 0.445,-3.683
3D body: height 0.64, standoff 0.3, extent 5.296,-3.988 6.121,-3.683
3D body: height 0.3, standoff 0, extent 5.905,-3.988 6.464,-3.683
3D body: height 0.64, standoff 0.3, extent 5.296,-3.353 6.121,-3.048
3D body: height 0.3, standoff 0, extent 5.905,-3.353 6.464,-3.048
3D body: height 0.64, standoff 0.3, extent 5.296,-2.718 6.121,-2.413
3D body: height 0.3, standoff 0, extent 5.905,-2.718 6.464,-2.413
3D body: height 0.64, standoff 0.3, extent 5.296,-2.083 6.121,-1.778
3D body: height 0.3, standoff 0, extent 5.905,-2.083 6.464,-1.778
3D body: height 0.64, standoff 0.3, extent 5.296,-1.448 6.121,-1.143
3D body: height 0.3, standoff 0, extent 5.905,-1.448 6.464,-1.143
3D body: height 0.64, standoff 0.3, extent 5.296,-0.813 6.121,-0.508
3D body: height 0.3, standoff 0, extent 5.905,-0.813 6.464,-0.508
3D body: height 0.64, standoff 0.3, extent 5.296,-0.178 6.121,0.127
3D body: height 0.3, standoff 0, extent 5.905,-0.178 6.464,0.127

## TSSOP16 [mil]
pads (16):
  rect 50x12 smd: 1(0,0)
  oval 50x12 smd: 2(0,-25) 3(0,-50) 4(0,-75) 5(0,-100) 6(0,-125) 7(0,-150) 8(0,-175) 9(237,-175) 10(237,-150) 11(237,-125) 12(237,-100) 13(237,-75) 14(237,-50) 15(237,-25) 16(237,0)
Top Overlay:
  rectangle: 45,-11 193,12.5
  lines w5: 112.25,12.5 -37,12.5 -37,-187.5 273,-187.5 273,12.5 124.75,12.5
3D body: height 40, standoff 0, extent 24.04,-188 212,13
3D body: height 12, standoff 0, extent -11,-6 11,6
3D body: height 25, standoff 12, extent 2.5,-6 35,6
3D body: height 41, standoff 40, extent 79,-14 157,11
3D body: height 25, standoff 12, extent 2.5,-31 35,-19
3D body: height 12, standoff 0, extent -11,-31 11,-19
3D body: height 25, standoff 12, extent 2.5,-56 35,-44
3D body: height 12, standoff 0, extent -11,-56 11,-44
3D body: height 25, standoff 12, extent 2.5,-81 35,-69
3D body: height 12, standoff 0, extent -11,-81 11,-69
3D body: height 25, standoff 12, extent 2.5,-106 35,-94
3D body: height 12, standoff 0, extent -11,-106 11,-94
3D body: height 25, standoff 12, extent 2.5,-131 35,-119
3D body: height 12, standoff 0, extent -11,-131 11,-119
3D body: height 25, standoff 12, extent 2.5,-156 35,-144
3D body: height 12, standoff 0, extent -11,-156 11,-144
3D body: height 25, standoff 12, extent 2.5,-181 35,-169
3D body: height 12, standoff 0, extent -11,-181 11,-169
3D body: height 25, standoff 12, extent 202,-181 234.5,-169
3D body: height 12, standoff 0, extent 226,-181 248,-169
3D body: height 25, standoff 12, extent 202,-156 234.5,-144
3D body: height 12, standoff 0, extent 226,-156 248,-144
3D body: height 25, standoff 12, extent 202,-131 234.5,-119
3D body: height 12, standoff 0, extent 226,-131 248,-119
3D body: height 25, standoff 12, extent 202,-106 234.5,-94
3D body: height 12, standoff 0, extent 226,-106 248,-94
3D body: height 25, standoff 12, extent 202,-81 234.5,-69
3D body: height 12, standoff 0, extent 226,-81 248,-69
3D body: height 25, standoff 12, extent 202,-56 234.5,-44
3D body: height 12, standoff 0, extent 226,-56 248,-44
3D body: height 25, standoff 12, extent 202,-31 234.5,-19
3D body: height 12, standoff 0, extent 226,-31 248,-19
3D body: height 25, standoff 12, extent 202,-6 234.5,6
3D body: height 12, standoff 0, extent 226,-6 248,6

## TSSOP20 [mm]
pads (20):
  rect 1.5x0.3 smd: 1(0,0)
  oval 1.5x0.3 smd: 2(0,-0.65) 3(0,-1.3) 4(0,-1.95) 5(0,-2.6) 6(0,-3.25) 7(0,-3.9) 8(0,-4.55) 9(0,-5.2) 10(0,-5.85) 11(6.4,-5.85) 12(6.4,-5.2) 13(6.4,-4.55) 14(6.4,-3.9) 15(6.4,-3.25) 16(6.4,-2.6) 17(6.4,-1.95) 18(6.4,-1.3) 19(6.4,-0.65) 20(6.4,0)
Top Overlay:
  rectangle: 1.93,-0.559 4.445,0.479
  lines w0.127: -1.059,0 -1.059,0.055 ; -0.635,0.479 -1.059,0.479 ; -1.059,0.479 7.459,0.479 7.459,-6.329 -1.059,-6.329 -1.059,0.479
3D body: height 0.64, standoff 0.3, extent 0.241,-5.359 1.067,-5.055
3D body: height 0.3, standoff 0, extent -0.102,-5.359 0.457,-5.055
3D body: height 0.64, standoff 0.3, extent 0.241,-5.994 1.067,-5.69
3D body: height 0.3, standoff 0, extent -0.102,-5.994 0.457,-5.69
3D body: height 0.64, standoff 0.3, extent 5.309,-5.994 6.134,-5.69
3D body: height 0.3, standoff 0, extent 5.918,-5.994 6.477,-5.69
3D body: height 0.64, standoff 0.3, extent 5.309,-5.359 6.134,-5.055
3D body: height 0.3, standoff 0, extent 5.918,-5.359 6.477,-5.055
3D body: height 0.3, standoff 0, extent 5.931,-0.152 6.49,0.152
3D body: height 0.64, standoff 0.3, extent 5.321,-0.152 6.147,0.152
3D body: height 0.3, standoff 0, extent 5.931,-0.787 6.49,-0.483
3D body: height 0.64, standoff 0.3, extent 5.321,-0.787 6.147,-0.483
3D body: height 0.3, standoff 0, extent 5.931,-1.448 6.49,-1.143
3D body: height 0.64, standoff 0.3, extent 5.321,-1.448 6.147,-1.143
3D body: height 0.3, standoff 0, extent 5.931,-2.108 6.49,-1.803
3D body: height 0.64, standoff 0.3, extent 5.321,-2.108 6.147,-1.803
3D body: height 0.3, standoff 0, extent 5.931,-2.743 6.49,-2.438
3D body: height 0.64, standoff 0.3, extent 5.321,-2.743 6.147,-2.438
3D body: height 0.3, standoff 0, extent 5.931,-3.404 6.49,-3.099
3D body: height 0.64, standoff 0.3, extent 5.321,-3.404 6.147,-3.099
3D body: height 0.3, standoff 0, extent 5.931,-4.064 6.49,-3.759
3D body: height 0.64, standoff 0.3, extent 5.321,-4.064 6.147,-3.759
3D body: height 0.3, standoff 0, extent 5.931,-4.699 6.49,-4.394
3D body: height 0.64, standoff 0.3, extent 5.321,-4.699 6.147,-4.394
3D body: height 0.3, standoff 0, extent -0.089,-4.699 0.47,-4.394
3D body: height 0.64, standoff 0.3, extent 0.254,-4.699 1.079,-4.394
3D body: height 0.3, standoff 0, extent -0.089,-4.064 0.47,-3.759
3D body: height 0.64, standoff 0.3, extent 0.254,-4.064 1.079,-3.759
3D body: height 0.3, standoff 0, extent -0.089,-3.404 0.47,-3.099
3D body: height 0.64, standoff 0.3, extent 0.254,-3.404 1.079,-3.099
3D body: height 0.3, standoff 0, extent -0.089,-2.743 0.47,-2.438
3D body: height 0.64, standoff 0.3, extent 0.254,-2.743 1.079,-2.438
3D body: height 0.3, standoff 0, extent -0.089,-2.108 0.47,-1.803
3D body: height 0.64, standoff 0.3, extent 0.254,-2.108 1.079,-1.803
3D body: height 0.3, standoff 0, extent -0.089,-1.448 0.47,-1.143
3D body: height 0.64, standoff 0.3, extent 0.254,-1.448 1.079,-1.143
3D body: height 0.3, standoff 0, extent -0.089,-0.787 0.47,-0.483
3D body: height 0.64, standoff 0.3, extent 0.254,-0.787 1.079,-0.483
3D body: height 1.04, standoff 1.02, extent 2.197,-0.356 4.178,0.279
3D body: height 0.64, standoff 0.3, extent 0.254,-0.152 1.079,0.152
3D body: height 0.3, standoff 0, extent -0.089,-0.152 0.47,0.152
3D body: height 1.02, standoff 0, extent 0.801,-6.325 5.575,0.33